# Altium footprint library PHOENIX THD.PcbLib: 109 footprints (part 1 of 8)
Each footprint in its own frame and in the unit in brackets; x right, y up, seen from the top. Pads: shape width x height; smd on the part's side, far side on the other; paste and mask are expansions set on the pad; w line width, h text height; cw(c..) or ccw(c..) is an arc to the next point about the centre after c.
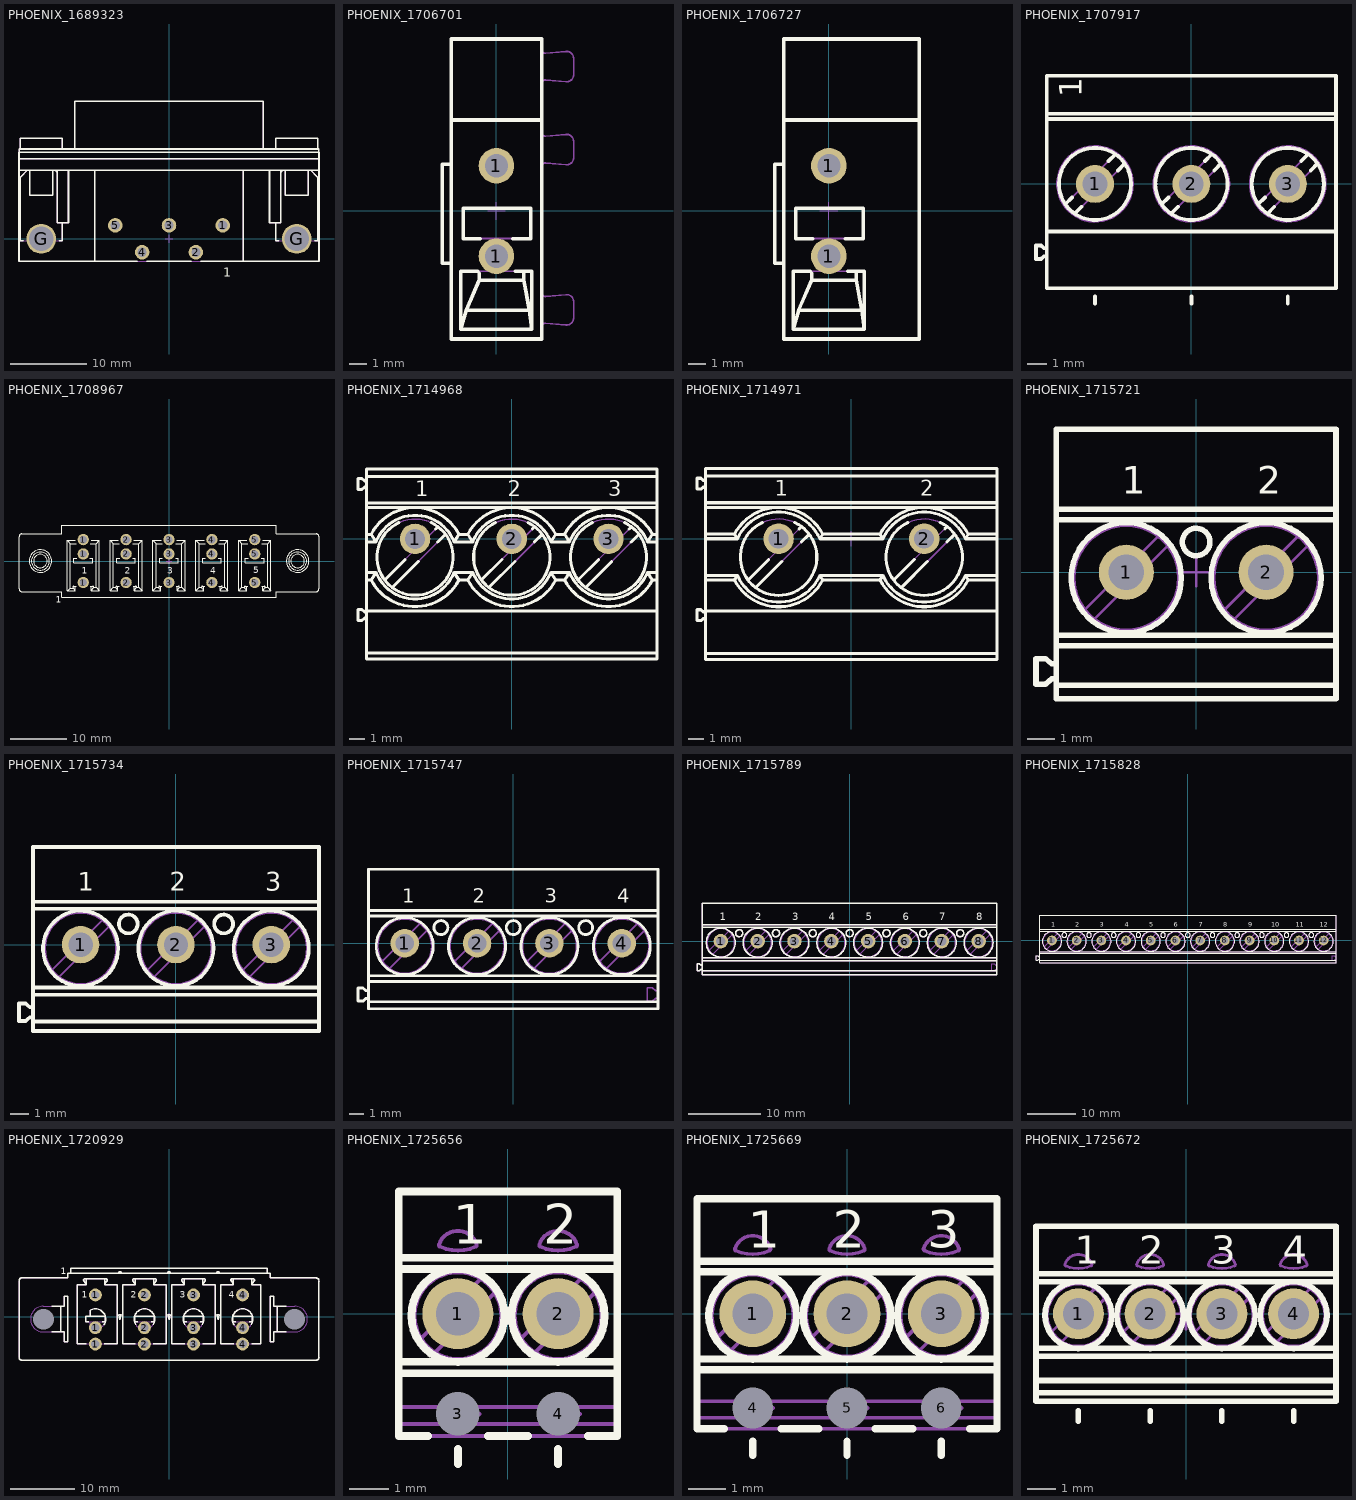
[diagram p0: the footprints below, top view; thin cyan lines are the x and y axes]

## PHOENIX_1689323 [mm] "Pitch 3.5mm, 5-Positions POWER-SUBCON Shielded Header, With Capacitive  Ground Connection"
height 13.7
pads (7):
  round 1.9 hole 1.2: 1(7,1.75) 2(3.5,-1.75) 3(0,1.75) 4(-3.5,-1.75) 5(-7,1.75)
  round 3.9 hole 3.2: G(-16.65,0) G(16.65,0)
Top Overlay:
  lines w0.2: -19.55,8.95 19.55,8.95 ; -19.55,10.45 19.55,10.45 ; -19.54,11.25 -19.54,11.7 19.54,11.7 19.54,11.25 ; -19.4,11.7 -19.4,13.105 -13.9,13.105 -13.9,11.7 ; -18.984,-0.275 -19.4,-0.275 -19.4,8 -18.45,8.95 ; -18.15,8.95 -18.15,5.7 -15.15,5.7 -15.15,8.95 ; -14.85,8.95 -14.55,8.65 ; -14.55,8.95 -14.55,2.1 -13.1,2.1 -13.1,8.95 ; -14.316,-0.275 -13.9,-0.275 -13.9,2.1 ; -12.299,11.7 -12.299,17.9 ; -12.26,17.9 12.299,17.9 12.299,11.7 ; -9.7,-2.95 -9.7,8.95 ; -4.118,-2.95 -19.55,-2.95 -19.55,11.25 19.55,11.25 19.55,-2.95 4.118,-2.95 ; -2.882,-2.95 2.882,-2.95 ; 9.7,-2.95 9.7,8.95 ; 13.1,8.95 13.1,2.1 14.55,2.1 14.55,8.95 ; 13.9,2.1 13.9,-0.275 14.316,-0.275 ; 13.9,11.7 13.9,13.105 19.4,13.105 19.4,11.7 ; 14.55,8.65 14.85,8.95 ; 15.15,8.95 15.15,5.7 18.15,5.7 18.15,8.95 ; 18.45,8.95 19.4,8 19.4,-0.275 18.984,-0.275
  text "1" at 7.05,-4.925 h1.2
Mechanical 8:
  lines w0.1: -17.15,0 -16.65,0 ; -16.65,-0.5 -16.65,0 ; -16.65,0.5 -16.65,0 ; -16.15,0 -16.65,0 ; -7.5,1.75 -7,1.75 ; -7,1.25 -7,1.75 ; -7,2.25 -7,1.75 ; -6.5,1.75 -7,1.75 ; -4,-1.75 -3.5,-1.75 ; -3.5,-2.25 -3.5,-1.75 ; -3.5,-1.25 -3.5,-1.75 ; -3,-1.75 -3.5,-1.75 ; -0.5,0 0,0 ; -0.5,1.75 0,1.75 ; 0,-0.5 0,0 ; 0,0.5 0,0 ; 0,1.25 0,1.75 ; 0,2.25 0,1.75 ; 0.5,0 0,0 ; 0.5,1.75 0,1.75 ; 3,-1.75 3.5,-1.75 ; 3.5,-2.25 3.5,-1.75 ; 3.5,-1.25 3.5,-1.75 ; 4,-1.75 3.5,-1.75 ; 6.5,1.75 7,1.75 ; 7,1.25 7,1.75 ; 7,2.25 7,1.75 ; 7.5,1.75 7,1.75 ; 16.15,0 16.65,0 ; 16.65,-0.5 16.65,0 ; 16.65,0.5 16.65,0 ; 17.15,0 16.65,0
Mechanical 14:
  lines w0.1: -19.55,8.95 19.55,8.95 ; -19.55,10.45 19.55,10.45 ; -19.54,11.25 -19.54,11.7 19.54,11.7 19.54,11.25 ; -19.4,11.7 -19.4,13.105 -13.9,13.105 -13.9,11.7 ; -18.45,8.95 -19.4,8 -19.4,-0.275 -13.9,-0.275 -13.9,2.1 ; -18.15,8.95 -18.15,5.7 -15.15,5.7 -15.15,8.95 ; -14.85,8.95 -14.55,8.65 ; -14.55,8.95 -14.55,2.1 -13.1,2.1 -13.1,8.95 ; -12.299,11.7 -12.299,17.9 ; -12.26,17.9 12.299,17.9 12.299,11.7 ; -9.7,-2.95 -9.7,8.95 ; 9.7,-2.95 9.7,8.95 ; 13.1,8.95 13.1,2.1 14.55,2.1 14.55,8.95 ; 13.9,2.1 13.9,-0.275 19.4,-0.275 19.4,8 18.45,8.95 ; 13.9,11.7 13.9,13.105 19.4,13.105 19.4,11.7 ; 14.55,8.65 14.85,8.95 ; 15.15,8.95 15.15,5.7 18.15,5.7 18.15,8.95 ; -19.55,-2.95 -19.55,11.25 19.55,11.25 19.55,-2.95 -19.55,-2.95
  text "1" at 7.05,-4.925 h1.2
3D body "PHOENIX_1689323.stp": height 13.65, standoff -4.1, extent -19.55,-2.95 19.55,17.9

## PHOENIX_1706701 [mm] "16A 400V, 1 Position PCB Terminal Block, Pitch 5.08mm (Conductor/PCB connection direction: 45°)"
height 14.2
pads (2):
  round 2 hole 1.3: 1(0,-2.54) 1(0,2.54)
Top Overlay:
  lines w0.2: -2.54,-2.935 -3.04,-2.935 -3.04,2.619 -2.54,2.619 ; -2.54,5.11 2.54,5.11 ; -1.052,-3.386 -2.01,-3.386 -2.01,-6.638 ; -0.96,-3.489 -0.96,-3.881 ; -0.915,-1.547 -1.86,-1.547 -1.86,0.15 1.94,0.15 1.94,-1.547 0.915,-1.547 ; 1.052,-3.386 1.99,-3.386 1.99,-6.638 ; 1.54,-3.386 1.54,-3.881 ; 2.5,9.66 -2.54,9.66 -2.54,-7.19 2.54,-7.19 2.54,9.66 ; -2.01,-6.638 -1.701,-5.578 ; -2.01,-6.638 1.99,-6.638 ; -1.701,-5.578 1.858,-5.578 ; -1.701,-5.578 -0.96,-3.881 ; -0.96,-3.881 1.54,-3.881 ; 1.54,-3.881 1.858,-5.578 ; 1.858,-5.578 1.99,-6.638
Mechanical 8:
  circle w0.05: c0,-2.54 r0.65
  circle w0.05: c0,2.54 r0.65
  lines w0.05: -0.5,-2.54 0,-2.54 ; -0.5,0 0,0 ; -0.5,2.54 0,2.54 ; 0,-3.04 0,-2.54 ; 0,-2.04 0,-2.54 ; 0,-0.5 0,0 ; 0,0.5 0,0 ; 0,2.04 0,2.54 ; 0,3.04 0,2.54 ; 0.5,-2.54 0,-2.54 ; 0.5,0 0,0 ; 0.5,2.54 0,2.54
Mechanical 14:
  lines w0.1: -2.54,-2.935 -3.04,-2.935 -3.04,2.619 -2.54,2.619 ; -2.54,5.11 2.54,5.11 ; -0.96,-3.386 -0.96,-3.881 ; 1.54,-3.386 1.54,-3.881 ; 2.54,-6.5 cw(c2.74,-6.5) 2.757,-6.301 3.905,-6.401 ccw(c3.94,-6.003) 4.34,-6.003 4.34,-5.097 ccw(c3.94,-5.097) 3.905,-4.699 2.757,-4.799 cw(c2.74,-4.6) 2.54,-4.6 ; 2.54,2.5 cw(c2.74,2.5) 2.757,2.699 3.905,2.599 ccw(c3.94,2.997) 4.34,2.997 4.34,3.903 ccw(c3.94,3.903) 3.905,4.301 2.757,4.201 cw(c2.74,4.4) 2.54,4.4 ; 2.54,7.16 cw(c2.74,7.16) 2.757,7.359 3.905,7.259 ccw(c3.94,7.657) 4.34,7.657 4.34,8.563 ccw(c3.94,8.563) 3.905,8.961 2.757,8.861 cw(c2.74,9.06) 2.54,9.06 ; -2.01,-6.638 -1.701,-5.578 ; -2.01,-6.638 1.99,-6.638 ; -2.01,-6.638 -2.01,-3.386 1.99,-3.386 1.99,-6.638 ; -1.701,-5.578 1.858,-5.578 ; -1.701,-5.578 -0.96,-3.881 ; -0.96,-3.881 1.54,-3.881 ; 1.54,-3.881 1.858,-5.578 ; 1.858,-5.578 1.99,-6.638 ; -2.54,-7.19 -2.54,9.66 2.54,9.66 2.54,-7.19 -2.54,-7.19 ; -1.86,-1.547 -1.86,0.15 1.94,0.15 1.94,-1.547 -1.86,-1.547
3D body "PHOENIX_1706701.stp": height 14.2, standoff -3.5, extent -3.04,-7.19 4.34,9.66

## PHOENIX_1706727 [mm] "16A 320V, 1 Position PCB Terminal Block, Pitch 7.62mm (Conductor/PCB connection direction: 45°)"
height 14.2
pads (2):
  round 2 hole 1.3: 1(0,-2.54) 1(0,2.54)
Top Overlay:
  lines w0.2: -2.54,-2.935 -3.04,-2.935 -3.04,2.619 -2.54,2.619 ; -2.54,5.11 5.08,5.11 ; -1.052,-3.386 -2.01,-3.386 -2.01,-6.638 ; -0.96,-3.489 -0.96,-3.881 ; -0.915,-1.547 -1.86,-1.547 -1.86,0.15 1.94,0.15 1.94,-1.547 0.915,-1.547 ; 1.052,-3.386 1.99,-3.386 1.99,-6.638 ; 1.54,-3.386 1.54,-3.881 ; -2.01,-6.638 -1.701,-5.578 ; -2.01,-6.638 1.99,-6.638 ; -1.701,-5.578 -0.96,-3.881 ; -1.701,-5.578 1.858,-5.578 ; -0.96,-3.881 1.54,-3.881 ; 1.54,-3.881 1.858,-5.578 ; 1.858,-5.578 1.99,-6.638 ; -2.54,-7.19 5.08,-7.19 5.08,9.66 -2.54,9.66 -2.54,-7.19
Mechanical 8:
  circle w0.05: c0,2.54 r0.65
  circle w0.05: c0,-2.54 r0.65
  lines w0.05: -0.5,-2.54 0,-2.54 ; -0.5,0 0,0 ; -0.5,2.54 0,2.54 ; 0,-3.04 0,-2.54 ; 0,-2.04 0,-2.54 ; 0,-0.5 0,0 ; 0,0.5 0,0 ; 0,2.04 0,2.54 ; 0,3.04 0,2.54 ; 0.5,-2.54 0,-2.54 ; 0.5,0 0,0 ; 0.5,2.54 0,2.54
Mechanical 14:
  lines w0.1: -2.54,-2.935 -3.04,-2.935 -3.04,2.619 -2.54,2.619 ; -2.54,5.11 5.08,5.11 ; -0.96,-3.386 -0.96,-3.881 ; 1.54,-3.386 1.54,-3.881 ; -2.01,-6.638 -2.01,-3.386 1.99,-3.386 1.99,-6.638 ; -2.01,-6.638 -1.701,-5.578 ; -2.01,-6.638 1.99,-6.638 ; -1.701,-5.578 -0.96,-3.881 ; -1.701,-5.578 1.858,-5.578 ; -0.96,-3.881 1.54,-3.881 ; 1.54,-3.881 1.858,-5.578 ; 1.858,-5.578 1.99,-6.638 ; -2.54,-7.19 5.08,-7.19 5.08,9.66 -2.54,9.66 -2.54,-7.19 ; -1.86,-1.547 -1.86,0.15 1.94,0.15 1.94,-1.547 -1.86,-1.547
3D body "PHOENIX_1706727.stp": height 14.2, standoff -3.5, extent -3.04,-7.19 5.08,9.66

## PHOENIX_1707917 [mm] "PHOENIX MKDS Serie, Pitch 5.08mm, 24A, 400V, 3 Positions Header"
height 18
pads (3):
  round 2 hole 1.3: 1(-5.08,0) 2(0,0) 3(5.08,0)
Top Overlay:
  circle w0.2: c5.08,0 r1.9
  circle w0.2: c0,0 r1.9
  circle w0.2: c-5.08,0 r1.9
  lines w0.2: -7.62,-3.807 -7.749,-3.807 -7.927,-3.957 -8.19,-3.957 -8.19,-3.243 -7.927,-3.243 -7.749,-3.393 -7.62,-3.393 ; -7.62,-2.5 7.62,-2.5 ; -7.62,3.427 7.62,3.427 ; -7.62,3.703 7.62,3.703 ; -6.648,-1.073 -6.286,-0.711 ; -6.153,-1.568 -5.791,-1.206 ; -5.08,-6.31 -5.08,-5.929 ; -4.369,1.206 -4.007,1.568 ; -3.874,0.711 -3.512,1.073 ; -1.568,-1.073 -1.206,-0.711 ; -1.073,-1.568 -0.711,-1.206 ; 0,-6.31 0,-5.929 ; 0.711,1.206 1.073,1.568 ; 1.206,0.711 1.568,1.073 ; 3.512,-1.073 3.874,-0.711 ; 4.007,-1.568 4.369,-1.206 ; 5.08,-6.31 5.08,-5.929 ; 5.791,1.206 6.153,1.568 ; 6.286,0.711 6.648,1.073 ; -7.62,-5.5 7.62,-5.5 7.62,5.7 -7.62,5.7 -7.62,-5.5
  text "1" at -5.775,4.575 h1.2
Mechanical 8:
  lines w0.1: -5.58,0 -5.08,0 ; -5.08,-0.5 -5.08,0 ; -5.08,0.5 -5.08,0 ; -4.58,0 -5.08,0 ; -0.5,0 0,0 ; 0,-0.5 0,0 ; 0,0.5 0,0 ; 0.5,0 0,0 ; 4.58,0 5.08,0 ; 5.08,-0.5 5.08,0 ; 5.08,0.5 5.08,0 ; 5.58,0 5.08,0
Mechanical 14:
  circle w0.1: c-5.08,0 r2
  circle w0.1: c0,0 r2
  circle w0.1: c5.08,0 r2
  circle w0.1: c5.08,0 r1.9
  circle w0.1: c0,0 r1.9
  circle w0.1: c-5.08,0 r1.9
  lines w0.1: -7.62,-3.807 -7.749,-3.807 -7.927,-3.957 -8.19,-3.957 -8.19,-3.243 -7.927,-3.243 -7.749,-3.393 -7.62,-3.393 ; -7.62,-2.5 7.62,-2.5 ; -7.62,3.427 7.62,3.427 ; -7.62,3.703 7.62,3.703 ; -6.648,-1.073 -4.007,1.568 ; -6.153,-1.568 -3.512,1.073 ; -1.568,-1.073 1.073,1.568 ; -1.073,-1.568 1.568,1.073 ; 3.512,-1.073 6.153,1.568 ; 4.007,-1.568 6.648,1.073 ; -7.62,-5.5 7.62,-5.5 7.62,5.7 -7.62,5.7 -7.62,-5.5
  text "1" at -5.775,4.575 h1.2
3D body "PHOENIX_1707917.stp": height 18.29, standoff -5, extent -8.19,-5.5 7.62,5.7

## PHOENIX_1708967 [mm] "PCB Header, 41A, 630V, Pitch: 7.62mm, 5 Positions, IPCV Serie"
height 30.1
pads (15):
  round 2 hole 1.3: 1(-15.24,-3.82) 1(-15.24,1.26) 1(-15.24,3.8) 2(-7.62,-3.82) 2(-7.62,1.26) 2(-7.62,3.8) 3(0,-3.82) 3(0,1.26) 3(0,3.8) 4(7.62,-3.82) 4(7.62,1.26) 4(7.62,3.8) 5(15.24,-3.82) 5(15.24,1.26) 5(15.24,3.8)
Top Overlay:
  drawing of 187 lines, arcs and shapes, not listed
  text "1" at -15.525,-2.225 h1.2
  text "2" at -7.905,-2.225 h1.2
  text "3" at -0.285,-2.225 h1.2
  text "4" at 7.335,-2.225 h1.2
  text "5" at 14.955,-2.17 h1.2
  text "1" at -20.11,-7.455 h1.2
Mechanical 8:
  lines w0.1: -15.74,-3.82 -15.24,-3.82 ; -15.74,1.26 -15.24,1.26 ; -15.74,3.8 -15.24,3.8 ; -15.24,-4.32 -15.24,-3.82 ; -15.24,-3.32 -15.24,-3.82 ; -15.24,0.76 -15.24,1.26 ; -15.24,1.76 -15.24,1.26 ; -15.24,3.3 -15.24,3.8 ; -15.24,4.3 -15.24,3.8 ; -14.74,-3.82 -15.24,-3.82 ; -14.74,1.26 -15.24,1.26 ; -14.74,3.8 -15.24,3.8 ; -8.12,-3.82 -7.62,-3.82 ; -8.12,1.26 -7.62,1.26 ; -8.12,3.8 -7.62,3.8 ; -7.62,-4.32 -7.62,-3.82 ; -7.62,-3.32 -7.62,-3.82 ; -7.62,0.76 -7.62,1.26 ; -7.62,1.76 -7.62,1.26 ; -7.62,3.3 -7.62,3.8 ; -7.62,4.3 -7.62,3.8 ; -7.12,-3.82 -7.62,-3.82 ; -7.12,1.26 -7.62,1.26 ; -7.12,3.8 -7.62,3.8 ; -0.5,-3.82 0,-3.82 ; -0.5,0 0,0 ; -0.5,1.26 0,1.26 ; -0.5,3.8 0,3.8 ; 0,-4.32 0,-3.82 ; 0,-3.32 0,-3.82 ; 0,-0.5 0,0 ; 0,0.5 0,0 ; 0,0.76 0,1.26 ; 0,1.76 0,1.26 ; 0,3.3 0,3.8 ; 0,4.3 0,3.8 ; 0.5,-3.82 0,-3.82 ; 0.5,0 0,0 ; 0.5,1.26 0,1.26 ; 0.5,3.8 0,3.8 ; 7.12,-3.82 7.62,-3.82 ; 7.12,1.26 7.62,1.26 ; 7.12,3.8 7.62,3.8 ; 7.62,-4.32 7.62,-3.82 ; 7.62,-3.32 7.62,-3.82 ; 7.62,0.76 7.62,1.26 ; 7.62,1.76 7.62,1.26 ; 7.62,3.3 7.62,3.8 ; 7.62,4.3 7.62,3.8 ; 8.12,-3.82 7.62,-3.82 ; 8.12,1.26 7.62,1.26 ; 8.12,3.8 7.62,3.8 ; 14.74,-3.82 15.24,-3.82 ; 14.74,1.26 15.24,1.26 ; 14.74,3.8 15.24,3.8 ; 15.24,-4.32 15.24,-3.82 ; 15.24,-3.32 15.24,-3.82 ; 15.24,0.76 15.24,1.26 ; 15.24,1.76 15.24,1.26 ; 15.24,3.3 15.24,3.8 ; 15.24,4.3 15.24,3.8 ; 15.74,-3.82 15.24,-3.82 ; 15.74,1.26 15.24,1.26 ; 15.74,3.8 15.24,3.8
Mechanical 14:
  text "1" at -15.525,-2.225 h1.2
  text "2" at -7.905,-2.225 h1.2
  text "3" at -0.285,-2.225 h1.2
  text "4" at 7.335,-2.225 h1.2
  text "5" at 14.955,-2.17 h1.2
  text "1" at -20.11,-7.455 h1.2
3D body "PHOENIX_1708967.stp": height 30.1, standoff -5, extent -26.66,-6.4 26.66,6.4

## PHOENIX_1714968 [mm] "Terminal Block, 30A 300V, Pitch 6.35mm, 3 Positions, Screw Connection"
height 21.5
pads (3):
  round 2 hole 1.3: 1(-6.35,0) 2(0,0) 3(6.35,0)
Top Overlay:
  lines w0.2: -9.525,-7.5 9.525,-7.5 ; -9.525,-5.207 -9.654,-5.207 -9.832,-5.357 -10.095,-5.357 -10.095,-4.643 -9.832,-4.643 -9.654,-4.793 -9.525,-4.793 ; -9.525,-4.729 9.525,-4.729 ; -9.525,-2.7 -9.233,-2.7 ; -9.525,-2.2 -8.912,-2.2 ; -9.525,-0.2 -8.912,-0.2 ; -9.525,0.3 -9.233,0.3 ; -9.525,2.05 9.525,2.05 ; -9.525,2.354 9.525,2.354 ; -9.525,3.393 -9.654,3.393 -9.832,3.243 -10.095,3.243 -10.095,3.957 -9.832,3.957 -9.654,3.807 -9.525,3.807 ; -9.525,4.1 9.525,4.1 ; -8.348,-2.703 -6.998,-1.353 ; -7.853,-3.198 -6.14,-1.485 ; -7.405,1.067 ccw(c-6.35,-1.2) -5.295,1.067 ; -4.997,0.648 -4.847,0.798 ; -4.865,-0.21 -4.352,0.303 ; -1.998,-2.703 -0.648,-1.353 ; -1.503,-3.198 0.21,-1.485 ; -1.055,1.067 ccw(c0,-1.2) 1.055,1.067 ; 1.353,0.648 1.503,0.798 ; 1.485,-0.21 1.998,0.303 ; 4.352,-2.703 5.702,-1.353 ; 4.847,-3.198 6.56,-1.485 ; 5.295,1.067 ccw(c6.35,-1.2) 7.405,1.067 ; 7.703,0.648 7.853,0.798 ; 7.835,-0.21 8.348,0.303 ; 9.525,-2.7 9.233,-2.7 ; 9.525,-2.2 8.912,-2.2 ; 9.525,-0.2 8.912,-0.2 ; 9.525,0.3 9.233,0.3 ; -9.233,-2.7 ccw(c-6.35,-1.2) -3.467,-2.7 ; -9.233,-2.7 -8.912,-2.2 ; -9.233,0.3 cw(c-6.35,-1.2) -3.467,0.3 ; -9.233,0.3 -8.912,-0.2 ; -8.912,-2.2 ccw(c-6.35,-1.2) -3.788,-2.2 ; -8.912,-0.2 cw(c-6.35,-1.2) -3.788,-0.2 ; -3.788,-2.2 -3.467,-2.7 ; -3.788,-2.2 -2.562,-2.2 ; -3.788,-0.2 -2.562,-0.2 ; -3.788,-0.2 -3.467,0.3 ; -3.467,-2.7 -2.883,-2.7 ; -3.467,0.3 -2.883,0.3 ; -2.883,-2.7 ccw(c0,-1.2) 2.883,-2.7 ; -2.883,-2.7 -2.562,-2.2 ; -2.883,0.3 cw(c0,-1.2) 2.883,0.3 ; -2.883,0.3 -2.562,-0.2 ; -2.562,-2.2 ccw(c0,-1.2) 2.562,-2.2 ; -2.562,-0.2 cw(c0,-1.2) 2.562,-0.2 ; 2.562,-2.2 2.883,-2.7 ; 2.562,-2.2 3.788,-2.2 ; 2.562,-0.2 3.788,-0.2 ; 2.562,-0.2 2.883,0.3 ; 2.883,-2.7 3.467,-2.7 ; 2.883,0.3 3.467,0.3 ; 3.467,-2.7 ccw(c6.35,-1.2) 9.233,-2.7 ; 3.467,-2.7 3.788,-2.2 ; 3.467,0.3 cw(c6.35,-1.2) 9.233,0.3 ; 3.467,0.3 3.788,-0.2 ; 3.788,-2.2 ccw(c6.35,-1.2) 8.912,-2.2 ; 3.788,-0.2 cw(c6.35,-1.2) 8.912,-0.2 ; 8.912,-2.2 9.233,-2.7 ; 8.912,-0.2 9.233,0.3 ; -9.525,-7.9 9.525,-7.9 9.525,4.6 -9.525,4.6 -9.525,-7.9
  text "3" at 6.35,2.8 h1
  text "2" at -0.279,2.8 h1
  text "1" at -6.35,2.8 h1
Mechanical 8:
  lines w0.1: -6.85,0 -6.35,0 ; -6.35,-0.5 -6.35,0 ; -6.35,0.5 -6.35,0 ; -5.85,0 -6.35,0 ; -0.5,0 0,0 ; 0,-0.5 0,0 ; 0,0.5 0,0 ; 0.5,0 0,0 ; 5.85,0 6.35,0 ; 6.35,-0.5 6.35,0 ; 6.35,0.5 6.35,0 ; 6.85,0 6.35,0
Mechanical 14:
  circle w0.1: c6.35,-1.2 r2.5
  circle w0.1: c0,-1.2 r2.5
  circle w0.1: c-6.35,-1.2 r2.5
  lines w0.1: -9.525,-7.5 9.525,-7.5 ; -9.525,-5.207 -9.654,-5.207 -9.832,-5.357 -10.095,-5.357 -10.095,-4.643 -9.832,-4.643 -9.654,-4.793 -9.525,-4.793 ; -9.525,-4.729 9.525,-4.729 ; -9.525,-2.7 -9.233,-2.7 ; -9.525,-2.2 -8.912,-2.2 ; -9.525,-0.2 -8.912,-0.2 ; -9.525,0.3 -9.233,0.3 ; -9.525,2.05 9.525,2.05 ; -9.525,2.354 9.525,2.354 ; -9.525,3.393 -9.654,3.393 -9.832,3.243 -10.095,3.243 -10.095,3.957 -9.832,3.957 -9.654,3.807 -9.525,3.807 ; -9.525,4.1 9.525,4.1 ; -8.348,-2.703 -4.847,0.798 ; -7.853,-3.198 -4.352,0.303 ; -1.998,-2.703 1.503,0.798 ; -1.503,-3.198 1.998,0.303 ; 4.352,-2.703 7.853,0.798 ; 4.847,-3.198 8.348,0.303 ; 9.525,-2.7 9.233,-2.7 ; 9.525,-2.2 8.912,-2.2 ; 9.525,-0.2 8.912,-0.2 ; 9.525,0.3 9.233,0.3 ; -9.233,-2.7 ccw(c-6.35,-1.2) -3.467,-2.7 ; -9.233,-2.7 -8.912,-2.2 ; -9.233,0.3 cw(c-6.35,-1.2) -3.467,0.3 ; -9.233,0.3 -8.912,-0.2 ; -8.912,-2.2 ccw(c-6.35,-1.2) -3.788,-2.2 ; -8.912,-0.2 cw(c-6.35,-1.2) -3.788,-0.2 ; -3.788,-2.2 -3.467,-2.7 ; -3.788,-2.2 -2.562,-2.2 ; -3.788,-0.2 -2.562,-0.2 ; -3.788,-0.2 -3.467,0.3 ; -3.467,-2.7 -2.883,-2.7 ; -3.467,0.3 -2.883,0.3 ; -2.883,-2.7 ccw(c0,-1.2) 2.883,-2.7 ; -2.883,-2.7 -2.562,-2.2 ; -2.883,0.3 cw(c0,-1.2) 2.883,0.3 ; -2.883,0.3 -2.562,-0.2 ; -2.562,-2.2 ccw(c0,-1.2) 2.562,-2.2 ; -2.562,-0.2 cw(c0,-1.2) 2.562,-0.2 ; 2.562,-2.2 2.883,-2.7 ; 2.562,-2.2 3.788,-2.2 ; 2.562,-0.2 3.788,-0.2 ; 2.562,-0.2 2.883,0.3 ; 2.883,-2.7 3.467,-2.7 ; 2.883,0.3 3.467,0.3 ; 3.467,-2.7 ccw(c6.35,-1.2) 9.233,-2.7 ; 3.467,-2.7 3.788,-2.2 ; 3.467,0.3 cw(c6.35,-1.2) 9.233,0.3 ; 3.467,0.3 3.788,-0.2 ; 3.788,-2.2 ccw(c6.35,-1.2) 8.912,-2.2 ; 3.788,-0.2 cw(c6.35,-1.2) 8.912,-0.2 ; 8.912,-2.2 9.233,-2.7 ; 8.912,-0.2 9.233,0.3 ; -9.525,-7.9 9.525,-7.9 9.525,4.6 -9.525,4.6 -9.525,-7.9
  text "1" at -6.35,2.8 h1
  text "2" at -0.279,2.8 h1
  text "3" at 6.35,2.8 h1
3D body "PHOENIX_1714968.stp": height 21.5, standoff -5, extent -10.095,-7.9 9.525,4.6

## PHOENIX_1714971 [mm] "Terminal Block, 32A 1kV, Pitch 9.52mm, 2 Positions, Screw Connection"
height 21.5
pads (2):
  round 2 hole 1.3: 1(-4.76,0) 2(4.76,0)
Top Overlay:
  lines w0.2: -9.525,-7.5 9.525,-7.5 ; -9.525,-5.207 -9.654,-5.207 -9.832,-5.357 -10.095,-5.357 -10.095,-4.643 -9.832,-4.643 -9.654,-4.793 -9.525,-4.793 ; -9.525,-4.729 9.525,-4.729 ; -9.525,-2.7 -7.643,-2.7 ; -9.525,0.3 -7.643,0.3 ; -9.525,2.05 9.525,2.05 ; -9.525,2.354 9.525,2.354 ; -9.525,3.393 -9.654,3.393 -9.832,3.243 -10.095,3.243 -10.095,3.957 -9.832,3.957 -9.654,3.807 -9.525,3.807 ; -9.525,4.1 9.525,4.1 ; -9.52,-2.4 -7.455,-2.4 ; -9.52,0 -7.455,0 ; -6.758,-2.703 -5.408,-1.353 ; -6.263,-3.198 -4.55,-1.485 ; -5.815,1.067 ccw(c-4.76,-1.2) -3.705,1.067 ; -3.407,0.648 -3.257,0.798 ; -3.275,-0.21 -2.762,0.303 ; 2.762,-2.703 4.112,-1.353 ; 3.257,-3.198 4.97,-1.485 ; 3.705,1.067 ccw(c4.76,-1.2) 5.815,1.067 ; 6.113,0.648 6.263,0.798 ; 6.245,-0.21 6.758,0.303 ; 9.52,0 7.455,0 ; 9.525,-2.7 7.643,-2.7 ; 9.525,-2.4 7.455,-2.4 ; 9.525,0.3 7.643,0.3 ; -7.643,-2.7 ccw(c-4.76,-1.2) -1.877,-2.7 ; -7.643,-2.7 -7.455,-2.4 ; -7.643,0.3 cw(c-4.76,-1.2) -1.877,0.3 ; -7.643,0.3 -7.455,0 ; -7.455,-2.4 ccw(c-4.76,-1.2) -2.065,-2.4 ; -7.455,0 cw(c-4.76,-1.2) -2.065,0 ; -2.065,-2.4 2.065,-2.4 ; -2.065,-2.4 -1.877,-2.7 ; -2.065,0 -1.877,0.3 ; -2.065,0 2.065,0 ; -1.877,-2.7 1.877,-2.7 ; -1.877,0.3 1.877,0.3 ; 1.877,-2.7 ccw(c4.76,-1.2) 7.643,-2.7 ; 1.877,-2.7 2.065,-2.4 ; 1.877,0.3 cw(c4.76,-1.2) 7.643,0.3 ; 1.877,0.3 2.065,0 ; 2.065,-2.4 ccw(c4.76,-1.2) 7.455,-2.4 ; 2.065,0 cw(c4.76,-1.2) 7.455,0 ; 7.455,-2.4 7.643,-2.7 ; 7.455,0 7.643,0.3 ; -9.525,-7.9 -9.525,4.6 9.525,4.6 9.525,-7.9 -9.525,-7.9
  text "1" at -5,2.8 h1
  text "2" at 4.5,2.8 h1
Mechanical 8:
  lines w0.05: -5.26,0 -4.76,0 ; -4.76,-0.5 -4.76,0 ; -4.76,0.5 -4.76,0 ; -4.26,0 -4.76,0 ; -0.5,0 0,0 ; 0,-0.5 0,0 ; 0,0.5 0,0 ; 0.5,0 0,0 ; 4.26,0 4.76,0 ; 4.76,-0.5 4.76,0 ; 4.76,0.5 4.76,0 ; 5.26,0 4.76,0
Mechanical 14:
  circle w0.1: c-4.76,-1.2 r2.5
  circle w0.1: c4.76,-1.2 r2.5
  lines w0.1: -9.525,-7.5 9.525,-7.5 ; -9.525,-5.207 -9.654,-5.207 -9.832,-5.357 -10.095,-5.357 -10.095,-4.643 -9.832,-4.643 -9.654,-4.793 -9.525,-4.793 ; -9.525,-4.729 9.525,-4.729 ; -9.525,-2.7 -7.643,-2.7 ; -9.525,0.3 -7.643,0.3 ; -9.525,2.05 9.525,2.05 ; -9.525,2.354 9.525,2.354 ; -9.525,3.393 -9.654,3.393 -9.832,3.243 -10.095,3.243 -10.095,3.957 -9.832,3.957 -9.654,3.807 -9.525,3.807 ; -9.525,4.1 9.525,4.1 ; -9.52,-2.4 -7.455,-2.4 ; -9.52,0 -7.455,0 ; -6.758,-2.703 -3.257,0.798 ; -6.263,-3.198 -2.762,0.303 ; 2.762,-2.703 6.263,0.798 ; 3.257,-3.198 6.758,0.303 ; 9.52,0 7.455,0 ; 9.525,-2.7 7.643,-2.7 ; 9.525,-2.4 7.455,-2.4 ; 9.525,0.3 7.643,0.3 ; -7.643,-2.7 ccw(c-4.76,-1.2) -1.877,-2.7 ; -7.643,-2.7 -7.455,-2.4 ; -7.643,0.3 cw(c-4.76,-1.2) -1.877,0.3 ; -7.643,0.3 -7.455,0 ; -7.455,-2.4 ccw(c-4.76,-1.2) -2.065,-2.4 ; -7.455,0 cw(c-4.76,-1.2) -2.065,0 ; -2.065,-2.4 2.065,-2.4 ; -2.065,-2.4 -1.877,-2.7 ; -2.065,0 -1.877,0.3 ; -2.065,0 2.065,0 ; -1.877,-2.7 1.877,-2.7 ; -1.877,0.3 1.877,0.3 ; 1.877,-2.7 ccw(c4.76,-1.2) 7.643,-2.7 ; 1.877,-2.7 2.065,-2.4 ; 1.877,0.3 cw(c4.76,-1.2) 7.643,0.3 ; 1.877,0.3 2.065,0 ; 2.065,-2.4 ccw(c4.76,-1.2) 7.455,-2.4 ; 2.065,0 cw(c4.76,-1.2) 7.455,0 ; 7.455,-2.4 7.643,-2.7 ; 7.455,0 7.643,0.3 ; -9.525,-7.9 -9.525,4.6 9.525,4.6 9.525,-7.9 -9.525,-7.9
  text "2" at 4.5,2.8 h1
  text "1" at -5,2.8 h1
3D body "PHOENIX_1714971.stp": height 21.5, standoff -5, extent -10.09,-7.9 9.52,4.6

## PHOENIX_1715721 [mm] "Terminal Block, 17.5A 400V, Pitch 5.08mm, 2 Positions, Screw Connection"
height 13.8
pads (2):
  round 2 hole 1.3: 1(-2.54,0) 2(2.54,0)
Top Overlay:
  circle w0.2: c2.54,-0.2 r2
  circle w0.2: c-2.54,-0.2 r2
  circle w0.2: c0,1.1 r0.5
  lines w0.2: -5.08,-4.1 5.08,-4.1 ; -5.08,-3.869 -5.247,-3.869 -5.479,-4.064 -5.821,-4.064 -5.821,-3.136 -5.479,-3.136 -5.247,-3.331 -5.08,-3.331 ; -5.08,-2.672 5.08,-2.672 ; -5.08,-2.283 5.08,-2.283 ; -5.08,1.909 5.08,1.909 ; -5.08,2.29 5.08,2.29 ; -5.08,-4.6 -5.08,5.2 5.08,5.2 5.08,-4.6 -5.08,-4.6
  text "2" at 2.222,2.857 h1
  text "1" at -2.699,2.857 h1
Mechanical 8:
  lines w0.1: -3.04,0 -2.54,0 ; -2.54,-0.5 -2.54,0 ; -2.54,0.5 -2.54,0 ; -2.04,0 -2.54,0 ; -0.5,0 0,0 ; 0,-0.5 0,0 ; 0,0.5 0,0 ; 0.5,0 0,0 ; 2.04,0 2.54,0 ; 2.54,-0.5 2.54,0 ; 2.54,0.5 2.54,0 ; 3.04,0 2.54,0
Mechanical 14:
  circle w0.1: c-2.54,-0.2 r1.891
  circle w0.1: c2.54,-0.2 r1.891
  circle w0.1: c0,1.1 r0.5
  circle w0.1: c-2.54,-0.2 r2
  circle w0.1: c2.54,-0.2 r2
  lines w0.1: -5.08,-4.1 5.08,-4.1 ; -5.08,-3.869 -5.247,-3.869 -5.479,-4.064 -5.821,-4.064 -5.821,-3.136 -5.479,-3.136 -5.247,-3.331 -5.08,-3.331 ; -5.08,-2.672 5.08,-2.672 ; -5.08,-2.283 5.08,-2.283 ; -5.08,1.909 5.08,1.909 ; -5.08,2.29 5.08,2.29 ; -4.043,-1.349 -1.391,1.303 ; -3.689,-1.703 -1.037,0.949 ; 1.037,-1.349 3.689,1.303 ; 1.391,-1.703 4.043,0.949 ; -5.08,-4.6 5.08,-4.6 5.08,5.2 -5.08,5.2 -5.08,-4.6
  text "2" at 2.222,2.857 h1
  text "1" at -2.699,2.857 h1
3D body "PHOENIX_1715721.stp": height 14.2, standoff -3.5, extent -5.821,-4.6 5.08,5.2
